# Altium footprint library Cty1.PcbLib: 1378 footprints (part 50 of 87)
Each footprint in its own frame and in the unit in brackets; x right, y up, seen from the top. Pads: shape width x height; smd on the part's side, far side on the other; paste and mask are expansions set on the pad; w line width, h text height; cw(c..) or ccw(c..) is an arc to the next point about the centre after c.
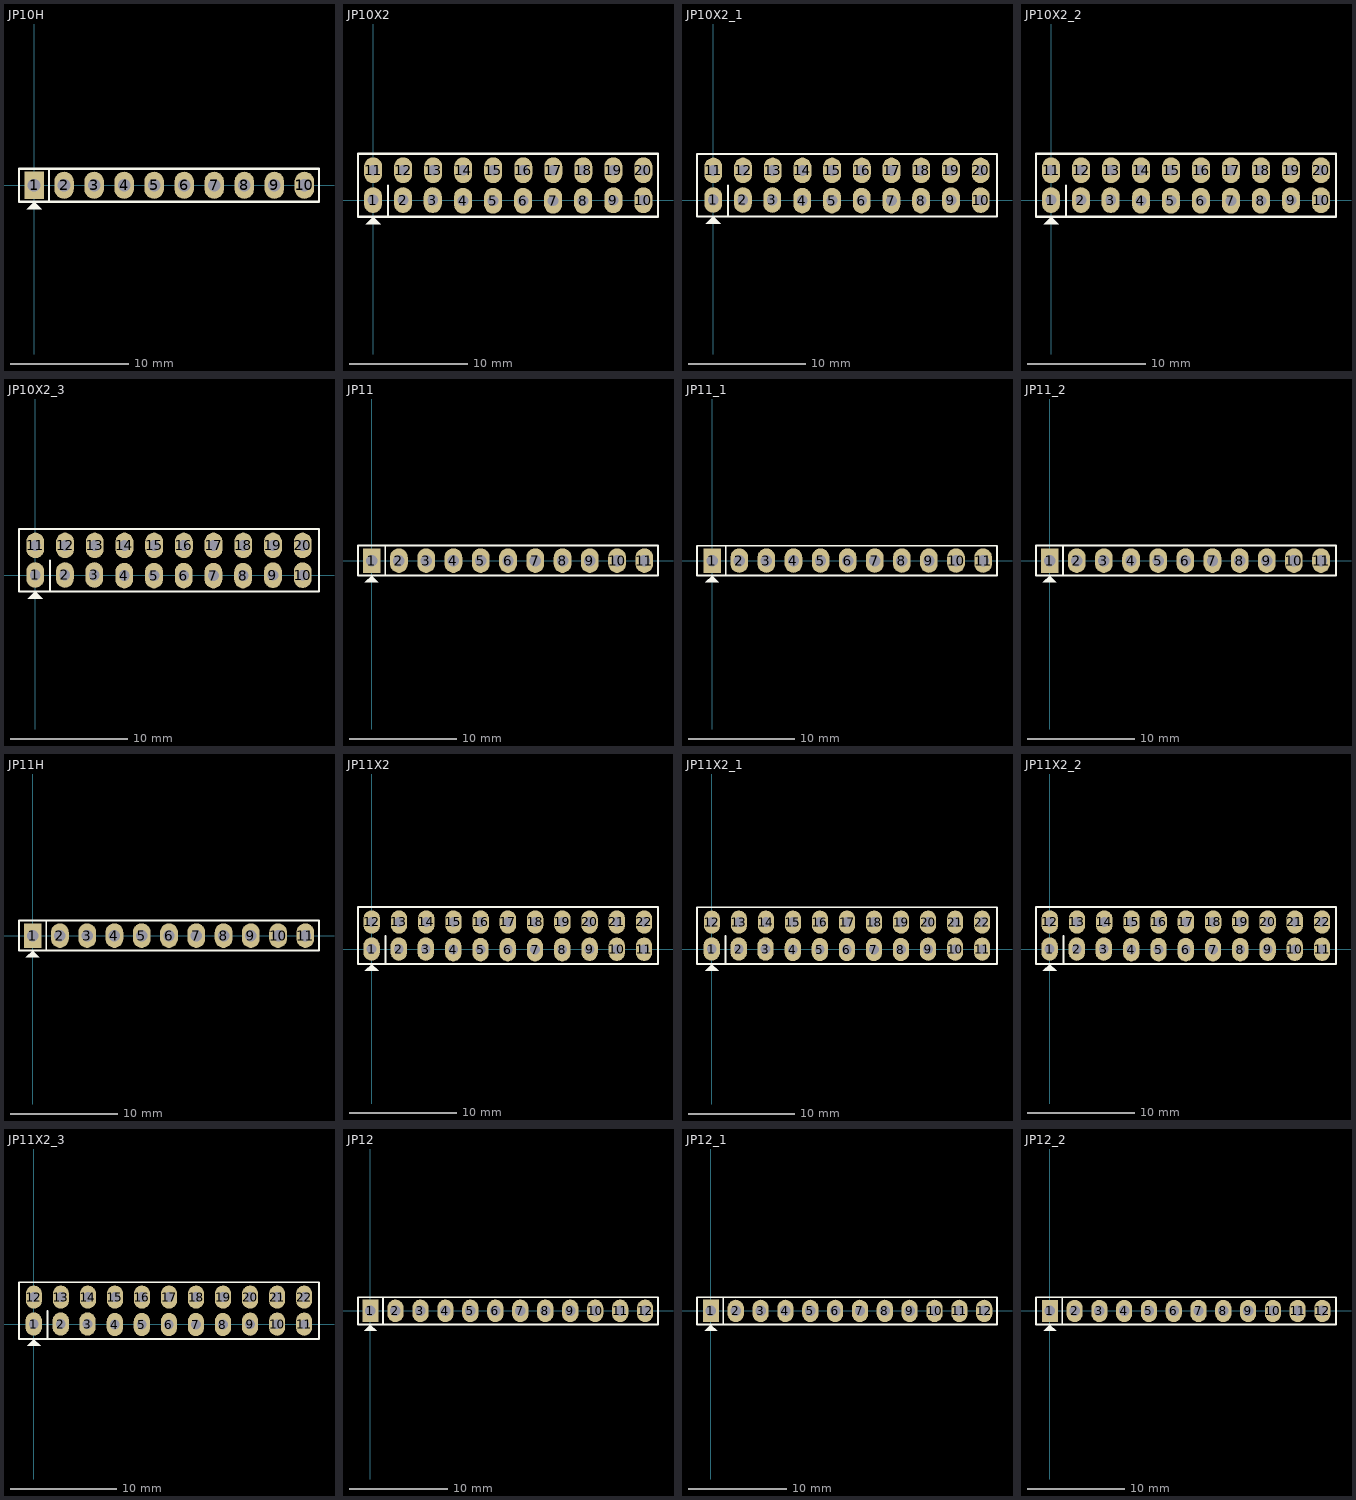
[diagram p49: the footprints below, top view; thin cyan lines are the x and y axes]

## JP10H [mil] "JP10"
height 200
pads (10):
  rect 65x90 hole 42: 1(0,0)
  oval 65x90 hole 42: 2(100,0) 3(200,0) 4(300,0) 5(400,0) 6(500,0) 7(600,0) 8(700,0) 9(800,0) 10(900,0)
Top Overlay:
  region: 0,-55 -25,-80 25,-80
  lines w7: 50,-55 50,55 ; -50,-55 -50,55 948.82,55 948.82,-55 -50,-55
3D body "pin_header_aw140-ea-g10g.stp": height 108.27, standoff -84.65, extent -45.28,-11.81 946.85,426.77

## JP10X2 [mil]
pads (20):
  oval 60x86 hole 36: 1(-0.5,0.5) 2(99.5,0.5) 3(198.5,0.5) 4(299.5,-1.5) 5(399.5,-1.5) 6(499.5,-1.5) 7(599.5,-1.5) 8(699.5,-1.5) 9(800,0) 10(900,0) 11(0,100) 12(100,100) 13(200,100) 14(300,100) 15(400,100) 16(500,100) 17(600,100) 18(700,100) 19(800,100) 20(900,100)
Top Overlay:
  region: 0,-55 -25,-80 25,-80
  lines w7: 50,-55 50,49 ; -50.5,-55 -50.5,50.5 -50.5,155 948.82,155 948.82,-55 -50.5,-55
3D body "pin_header_awl254-dg-g20d.stp": height 366.14, standoff -86.61, extent -51.18,-48.82 948.82,151.18

## JP10X2_1 [mil]
pads (20):
  oval 60x86 hole 36: 1(-0.5,0.5) 2(99.5,0.5) 3(198.5,0.5) 4(299.5,-1.5) 5(399.5,-1.5) 6(499.5,-1.5) 7(599.5,-1.5) 8(699.5,-1.5) 9(800,0) 10(900,0) 11(0,100) 12(100,100) 13(200,100) 14(300,100) 15(400,100) 16(500,100) 17(600,100) 18(700,100) 19(800,100) 20(900,100)
Top Overlay:
  region: 0,-55 -25,-80 25,-80
  lines w7: 50,-55 50,49 ; -55,-55 -55,46 -55,155 955,155 955,-55 -55,-55
3D body "female_header_a-bl254-dg-g20d.stp": height 366.14, standoff -94.49, extent -55.12,-47.24 954.72,149.61

## JP10X2_2 [mil]
pads (20):
  oval 60x86 hole 36: 1(-0.5,0.5) 2(99.5,0.5) 3(198.5,0.5) 4(299.5,-1.5) 5(399.5,-1.5) 6(499.5,-1.5) 7(599.5,-1.5) 8(699.5,-1.5) 9(800,0) 10(900,0) 11(0,100) 12(100,100) 13(200,100) 14(300,100) 15(400,100) 16(500,100) 17(600,100) 18(700,100) 19(800,100) 20(900,100)
Top Overlay:
  region: 0,-55 -25,-80 25,-80
  lines w7: 50,-55 50,49 ; -50.5,-55 950,-55 950,155 -50.5,155 -50.5,50.5 -50.5,-55
3D body "pin_header_awl254-da-g20d.stp": height 216.54, standoff -98.43, extent -49.21,-12.4 950.79,494.69

## JP10X2_3 [mil]
pads (20):
  oval 60x86 hole 36: 1(-0.5,0.5) 2(99.5,0.5) 3(198.5,0.5) 4(299.5,-1.5) 5(399.5,-1.5) 6(499.5,-1.5) 7(599.5,-1.5) 8(699.5,-1.5) 9(800,0) 10(900,0) 11(0,100) 12(100,100) 13(200,100) 14(300,100) 15(400,100) 16(500,100) 17(600,100) 18(700,100) 19(800,100) 20(900,100)
Top Overlay:
  region: 0,-55 -25,-80 25,-80
  lines w7: 50,-55 50,49 ; -55,-55 -55,46 -55,155 955,155 955,-55 -55,-55
3D body "female_header_a-bl254-da-g20d.stp": height 216.54, standoff -106.3, extent -54.13,-6.89 955.71,489.17

## JP11 [mil] "JP11"
height 200
pads (11):
  rect 65x90 hole 42: 1(0,0)
  oval 65x90 hole 42: 2(100,0) 3(200,0) 4(300,0) 5(400,0) 6(500,0) 7(600,0) 8(700,0) 9(800,0) 10(900,0) 11(1000,0)
Top Overlay:
  region: 0,-55 -25,-80 25,-80
  lines w7: 50,-55 50,55 ; -50,-55 1050,-55 1050,55 -50,55 -50,-55
3D body "pin_header_aw140-eg-g11d.stp": height 354.33, standoff -86.61, extent -45,-49.18 1055,49.18

## JP11_1 [mil] "JP11_1"
height 200
pads (11):
  rect 65x90 hole 42: 1(0,0)
  oval 65x90 hole 42: 2(100,0) 3(200,0) 4(300,0) 5(400,0) 6(500,0) 7(600,0) 8(700,0) 9(800,0) 10(900,0) 11(1000,0)
Top Overlay:
  region: 0,-55 -25,-80 25,-80
  lines w7: 50,-55 50,55 ; -56,-55 -56,55 1051.18,55 1051.18,-55 -56,-55
3D body "female_header_a-bl254-eg-g11d.stp": height 366.14, standoff -94.49, extent -55.12,-49.21 1054.73,49.21

## JP11_2 [mil] "JP11"
height 200
pads (11):
  rect 65x90 hole 42: 1(0,0)
  oval 65x90 hole 42: 2(100,0) 3(200,0) 4(300,0) 5(400,0) 6(500,0) 7(600,0) 8(700,0) 9(800,0) 10(900,0) 11(1000,0)
Top Overlay:
  region: 0,-55 -25,-80 25,-80
  lines w7: 50,-55 50,55 ; -50,-55 -50,55 1055,55 1055,-55 -50,-55
3D body "female_header_a-bl254-ea-g11d.stp": height 108.27, standoff -116.14, extent -53.15,-6.89 1056.69,389.17

## JP11H [mil] "JP11"
height 200
pads (11):
  rect 65x90 hole 42: 1(0,0)
  oval 65x90 hole 42: 2(100,0) 3(200,0) 4(300,0) 5(400,0) 6(500,0) 7(600,0) 8(700,0) 9(800,0) 10(900,0) 11(1000,0)
Top Overlay:
  region: 0,-55 -25,-80 25,-80
  lines w7: 50,-55 50,55 ; -50,-55 1050,-55 1050,55 -50,55 -50,-55
3D body "pin_header_aw140-ea-g11g.stp": height 108.27, standoff -84.65, extent -44.29,-13.78 1047.84,424.8

## JP11X2 [mil]
pads (22):
  oval 60x86 hole 36: 1(-0.5,0.5) 2(99.5,0.5) 3(198.5,0.5) 4(299.5,-1.5) 5(399.5,-1.5) 6(499.5,-1.5) 7(599.5,-1.5) 8(699.5,-1.5) 9(800,0) 10(900,0) 11(1000,0) 12(0,100) 13(100,100) 14(200,100) 15(300,100) 16(400,100) 17(500,100) 18(600,100) 19(700,100) 20(800,100) 21(900,100) 22(1000,100)
Top Overlay:
  region: 0,-55 -25,-80 25,-80
  lines w7: 50,-55 50,49 ; -50.5,-55 1051.18,-55 1051.18,155 -50.5,155 -50.5,50.5 -50.5,-55
3D body "pin_header_awl254-dg-g22d.stp": height 366.14, standoff -86.61, extent -50.2,-48.82 1049.8,151.18

## JP11X2_1 [mil]
pads (22):
  oval 60x86 hole 36: 1(-0.5,0.5) 2(99.5,0.5) 3(198.5,0.5) 4(299.5,-1.5) 5(399.5,-1.5) 6(499.5,-1.5) 7(599.5,-1.5) 8(699.5,-1.5) 9(800,0) 10(900,0) 11(1000,0) 12(0,100) 13(100,100) 14(200,100) 15(300,100) 16(400,100) 17(500,100) 18(600,100) 19(700,100) 20(800,100) 21(900,100) 22(1000,100)
Top Overlay:
  region: 0,-55 -25,-80 25,-80
  lines w7: 50,-55 50,49 ; -55,-55 1055,-55 1055,155 -55,155 -55,46 -55,-55
3D body "female_header_a-bl254-dg-g22d.stp": height 366.14, standoff -94.49, extent -55.12,-47.24 1054.73,149.61

## JP11X2_2 [mil]
pads (22):
  oval 60x86 hole 36: 1(-0.5,0.5) 2(99.5,0.5) 3(198.5,0.5) 4(299.5,-1.5) 5(399.5,-1.5) 6(499.5,-1.5) 7(599.5,-1.5) 8(699.5,-1.5) 9(800,0) 10(900,0) 11(1000,0) 12(0,100) 13(100,100) 14(200,100) 15(300,100) 16(400,100) 17(500,100) 18(600,100) 19(700,100) 20(800,100) 21(900,100) 22(1000,100)
Top Overlay:
  region: 0,-55 -25,-80 25,-80
  lines w7: 50,-55 50,49 ; -50.5,-55 -50.5,50.5 -50.5,155 1051.18,155 1051.18,-55 -50.5,-55
3D body "pin_header_awl254-da-g22d.stp": height 216.54, standoff -98.43, extent -50,-13 1050,494.09

## JP11X2_3 [mil]
pads (22):
  oval 60x86 hole 36: 1(-0.5,0.5) 2(99.5,0.5) 3(198.5,0.5) 4(299.5,-1.5) 5(399.5,-1.5) 6(499.5,-1.5) 7(599.5,-1.5) 8(699.5,-1.5) 9(800,0) 10(900,0) 11(1000,0) 12(0,100) 13(100,100) 14(200,100) 15(300,100) 16(400,100) 17(500,100) 18(600,100) 19(700,100) 20(800,100) 21(900,100) 22(1000,100)
Top Overlay:
  region: 0,-55 -25,-80 25,-80
  lines w7: 50,-55 50,49 ; -55,-55 -55,46 -55,155 1055,155 1055,-55 -55,-55
3D body "female_header_a-bl254-da-g22d.stp": height 216.54, standoff -106.3, extent -54.13,-7.87 1055.71,488.19

## JP12 [mil] "JP12"
height 200
pads (12):
  rect 65x90 hole 42: 1(0,0)
  oval 65x90 hole 42: 2(100,0) 3(200,0) 4(300,0) 5(400,0) 6(500,0) 7(600,0) 8(700,0) 9(800,0) 10(900,0) 11(1000,0) 12(1100,0)
Top Overlay:
  region: 0,-55 -25,-80 25,-80
  lines w7: 50,-55 50,55 ; -50,-55 1151.57,-55 1151.57,55 -50,55 -50,-55
3D body "pin_header_aw140-eg-g12d.stp": height 354.33, standoff -86.61, extent -50,-50 1150,48.36

## JP12_1 [mil] "JP12"
height 200
pads (12):
  rect 65x90 hole 42: 1(0,0)
  oval 65x90 hole 42: 2(100,0) 3(200,0) 4(300,0) 5(400,0) 6(500,0) 7(600,0) 8(700,0) 9(800,0) 10(900,0) 11(1000,0) 12(1100,0)
Top Overlay:
  region: 0,-55 -25,-80 25,-80
  lines w7: 50,-55 50,55 ; -56,-55 -56,55 1151.57,55 1151.57,-55 -56,-55
3D body "female_header_a-bl254-eg-g12d.stp": height 366.14, standoff -94.49, extent -55,-49.21 1154.84,49.21

## JP12_2 [mil] "JP12"
height 200
pads (12):
  rect 65x90 hole 42: 1(0,0)
  oval 65x90 hole 42: 2(100,0) 3(200,0) 4(300,0) 5(400,0) 6(500,0) 7(600,0) 8(700,0) 9(800,0) 10(900,0) 11(1000,0) 12(1100,0)
Top Overlay:
  region: 0,-55 -25,-80 25,-80
  lines w7: 50,-55 50,55 ; -56,-55 -56,55 1155,55 1155,-55 -56,-55
3D body "female_header_a-bl254-ea-g12d.stp": height 108.27, standoff -116.14, extent -55.12,-6.89 1154.73,389.17